# Altium footprint library BMS_Slave.PcbLib: 58 footprints (part 1 of 4)
Each footprint in its own frame and in the unit in brackets; x right, y up, seen from the top. Pads: shape width x height; smd on the part's side, far side on the other; paste and mask are expansions set on the pad; w line width, h text height; cw(c..) or ccw(c..) is an arc to the next point about the centre after c.
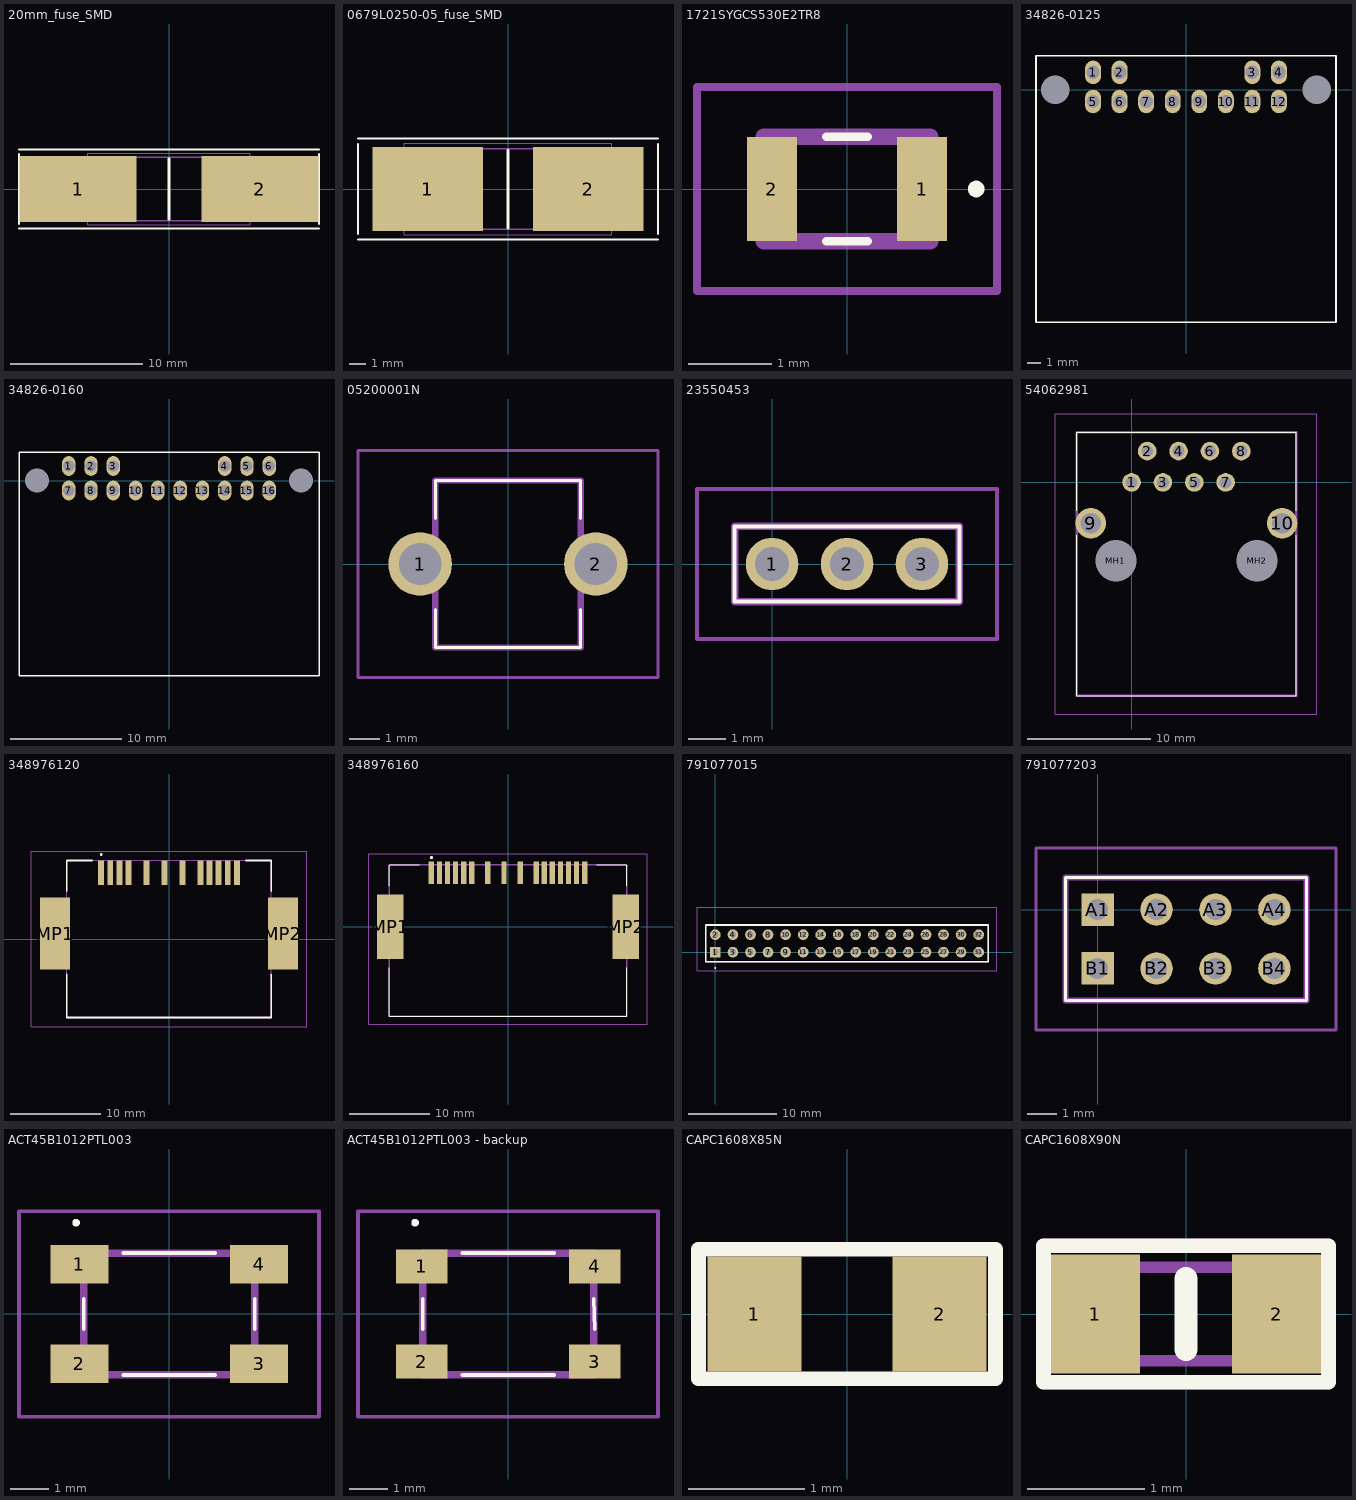
[diagram p0: the footprints below, top view; thin cyan lines are the x and y axes]

## 20mm_fuse_SMD [mm]
pads (2):
  rect 8.89x5 smd: 1(-6.895,0) 2(6.895,0)
Top Overlay:
  lines w0.127: -11.379,-3 11.379,-3 ; -11.379,-2.667 -11.379,2.667 ; -11.379,3 11.379,3 ; 11.379,-2.667 11.379,2.667
  lines w0.2: 0,-2.29 0,2.29
Mechanical 13:
  lines w0.1: -5.43,-2.39 5.43,-2.39 5.43,2.39 -5.43,2.39 -5.43,-2.39
Mechanical 15:
  lines w0.05: -6.15,-2.705 6.15,-2.705 6.15,2.705 -6.15,2.705 -6.15,-2.705
3D body "0885001.DR.stp": height 4.88, standoff 0, extent -5.43,-2.39 5.43,2.39

## 0679L0250-05_fuse_SMD [mm] "125VDC, Irated=0.25A Fuse"
pads (2):
  rect 6.533x5 smd: 1(-4.75,0) 2(4.75,0)
Top Overlay:
  lines w0.127: -8.89,-3 8.89,-3 ; -8.89,-2.667 -8.89,2.667 ; -8.89,3 8.89,3 ; 8.89,-2.667 8.89,2.667
  lines w0.2: 0,-2.29 0,2.29
Mechanical 13:
  lines w0.1: -5.43,-2.39 5.43,-2.39 5.43,2.39 -5.43,2.39 -5.43,-2.39
Mechanical 15:
  lines w0.05: -6.15,-2.705 6.15,-2.705 6.15,2.705 -6.15,2.705 -6.15,-2.705
3D body "0679L0250-05.STEP": height 2.78, standoff -0.01, extent -3.05,-1.27 3.05,1.27

## 1721SYGCS530E2TR8 [mm]
pads (2):
  rect 0.6x1.25 smd: 1(0.9,0) 2(-0.9,0)
Top Overlay:
  lines w0.1: -0.25,-0.625 0.25,-0.625 ; -0.25,0.625 0.25,0.625 ; 1.5,0 ccw(c1.55,0) 1.6,0 ccw(c1.55,0) 1.5,0
Mechanical 13:
  lines w0.2: -1,-0.625 1,-0.625 1,0.625 -1,0.625 -1,-0.625
Mechanical 15:
  lines w0.1: -1.8,-1.225 1.8,-1.225 1.8,1.225 -1.8,1.225 -1.8,-1.225
3D body "17-21SYGC_S530-E2_TR8.stp": height 1.2, standoff 0, extent -1.14,-0.625 1.14,0.625

## 34826-0125 [mm] "Molex, MINI50, 12ckt"
pads (14):
  round 0 hole 2.15 mask+0.05: 0(-9.85,0) 0(9.85,0)
  oval 1.2x1.778 hole 1 mask+0.05: 1(-7,1.3) 2(-5,1.3) 3(5,1.3) 4(7,1.3) 5(-7,-0.9) 6(-5,-0.9) 7(-3,-0.9) 8(-1,-0.9) 9(1,-0.9) 10(3,-0.9) 11(5,-0.9) 12(7,-0.9)
Top Overlay:
  lines w0.127: -11.303,-17.526 -11.303,2.54 11.303,2.54 11.303,-17.526 -11.303,-17.526
3D body "348260125.stp": height 11.75, standoff -4.14, extent -11.314,-17.478 11.314,2.022

## 34826-0160 [mm] "Molex, MINI50, 16ckt"
pads (18):
  round 0 hole 2.15 mask+0.05: 0(-11.85,0) 0(11.85,0)
  oval 1.2x1.778 hole 1 mask+0.05: 1(-9,1.3) 2(-7,1.3) 3(-5,1.3) 4(5,1.3) 5(7,1.3) 6(9,1.3) 7(-9,-0.9) 8(-7,-0.9) 9(-5,-0.9) 10(-3,-0.9) 11(-1,-0.9) 12(1,-0.9) 13(3,-0.9) 14(5,-0.9) 15(7,-0.9) 16(9,-0.9)
Top Overlay:
  lines w0.127: -13.462,-17.526 -13.462,2.54 13.462,2.54 13.462,-17.526 -13.462,-17.526
3D body "348260160.stp": height 11.69, standoff -4.19, extent -13.314,-17.427 13.314,2.073

## 05200001N [mm]
pads (2):
  round 2.1 hole 1.4: 1(-2.9,0) 2(2.9,0)
Top Overlay:
  lines w0.1: -2.4,-1.5 -2.4,-2.75 2.4,-2.75 2.4,-1.5 ; -2.4,1.5 -2.4,2.75 2.4,2.75 2.4,1.5
Mechanical 13:
  lines w0.2: -2.4,-2.75 -2.4,2.75 2.4,2.75 2.4,-2.75 -2.4,-2.75
Mechanical 15:
  lines w0.1: -4.95,-3.75 -4.95,3.75 4.95,3.75 4.95,-3.75 -4.95,-3.75
3D body "05200001N.stp": height 8.1, standoff -5, extent -3.495,-2.75 3.5,2.75

## 23550453 [mm]
pads (3):
  round 1.4 hole 0.9: 1(0,0) 2(2,0) 3(4,0)
Top Overlay:
  lines w0.1: -1,-1 -1,1 5,1 5,-1 -1,-1
Mechanical 13:
  lines w0.2: -1,-1 -1,1 5,1 5,-1 -1,-1
Mechanical 15:
  lines w0.1: -2,-2 -2,2 6,2 6,-2 -2,-2
3D body "2355045-3.stp": height 5.54, standoff -2.76, extent -1,-1 5,1

## 54062981 [mm]
pads (12):
  round 1.509 hole 0.97: 1(0,0) 2(1.27,2.54) 3(2.54,0) 4(3.81,2.54) 5(5.08,0) 6(6.35,2.54) 7(7.62,0) 8(8.89,2.54)
  round 2.475 hole 1.65: 9(-3.3,-3.3) 10(12.19,-3.3)
  round 1.665 hole 3.33 unplated: MH1(-1.27,-6.35) MH2(10.16,-6.35)
Top Overlay:
  lines w0.1: -4.445,-4.3 -4.445,-17.27 13.335,-17.27 13.335,-4.3 ; -4.445,-2.3 -4.445,4.07 13.335,4.07 13.335,-2.3
Mechanical 13:
  lines w0.2: -4.445,-17.27 -4.445,4.07 13.335,4.07 13.335,-17.27 -4.445,-17.27
Mechanical 15:
  lines w0.1: -6.173,-18.76 -6.173,5.54 14.99,5.54 14.99,-18.76 -6.173,-18.76
3D body "5406298-1.stp": height 14.1, standoff -4.39, extent -4.437,-17.074 13.257,4.262

## 348976120 [mm]
pads (14):
  rect 0.66x2.75 smd: 1(-7.5,7.325) 2(-5.5,7.325) 3(4.5,7.325) 4(6.5,7.325) 5(-6.5,7.325) 6(-4.5,7.325) 7(-2.5,7.325) 8(-0.5,7.325) 9(1.5,7.325) 10(3.5,7.325) 11(5.5,7.325) 12(7.5,7.325)
  rect 3.32x8 smd: MP1(-12.6,0.605) MP2(12.6,0.605)
Top Overlay:
  lines w0.2: -11.31,-8.675 -11.31,-3.925 -11.31,-8.675 ; -11.31,-8.675 11.31,-8.675 ; -11.31,-8.675 11.31,-8.675 ; -11.31,8.7 -8.5,8.7 -11.31,8.7 ; -11.31,8.7 -11.31,5.325 -11.31,8.7 ; -7.5,9.3 cw(c-7.5,9.35) -7.5,9.4 ; -7.5,9.3 ccw(c-7.5,9.35) -7.5,9.4 ; -7.5,9.3 cw(c-7.5,9.35) -7.5,9.4 ; 11.31,-8.675 11.31,-3.925 11.31,-8.675 ; 11.31,8.7 11.31,5.325 11.31,8.7 ; 11.31,8.7 8.5,8.7 11.31,8.7
Mechanical 13:
  lines w0.1: -11.31,-8.7 -11.31,8.7 11.31,8.7 11.31,-8.7 -11.31,-8.7
Mechanical 15:
  lines w0.1: -15.26,-9.7 -15.26,9.7 15.26,9.7 15.26,-9.7 -15.26,-9.7
3D body "34897-6120.stp": height 12.54, standoff 0, extent -13.928,-8.7 13.928,8.7

## 348976160 [mm]
pads (18):
  rect 0.66x2.75 smd: 1(-9.5,6.72) 2(-7.5,6.72) 3(-5.5,6.72) 4(4.5,6.72) 5(6.5,6.72) 6(8.5,6.72) 7(-8.5,6.72) 8(-6.5,6.72) 9(-4.5,6.72) 10(-2.5,6.72) 11(-0.5,6.72) 12(1.5,6.72) 13(3.5,6.72) 14(5.5,6.72) 15(7.5,6.72) 16(9.5,6.72)
  rect 3.32x8 smd: MP1(-14.6,0) MP2(14.6,0)
Top Overlay:
  lines w0.1: -14.745,-5.08 -14.745,-11.08 14.6,-11.08 14.745,-11.08 14.745,-5.08 ; -14.745,5.08 -14.745,7.62 -14.6,7.72 -11,7.72 ; 11,7.72 14.6,7.72 14.745,7.62 14.745,5.08
  lines w0.2: -9.6,8.6 ccw(c-9.5,8.6) -9.4,8.6 ccw(c-9.5,8.6) -9.6,8.6
Mechanical 13:
  lines w0.2: -14.745,-11.08 14.745,-11.08 14.745,7.72 -14.745,7.72 -14.745,-11.08
Mechanical 15:
  lines w0.1: -17.26,-12.08 17.26,-12.08 17.26,9.095 -17.26,9.095 -17.26,-12.08
3D body "34897-6160.stp": height 11.98, standoff 0, extent -15.928,-11.08 15.928,8.029

## 791077015 [mm]
pads (32):
  rect 1.217x1.217 hole 0.673: 1(0,0)
  round 1.217 hole 0.673: 2(0,2) 3(2,0) 4(2,2) 5(4,0) 6(4,2) 7(6,0) 8(6,2) 9(8,0) 10(8,2) 11(10,0) 12(10,2) 13(12,0) 14(12,2) 15(14,0) 16(14,2) 17(16,0) 18(16,2) 19(18,0) 20(18,2) 21(20,0) 22(20,2) 23(22,0) 24(22,2) 25(24,0) 26(24,2) 27(26,0) 28(26,2) 29(28,0) 30(28,2) 31(30,0) 32(30,2)
Top Overlay:
  lines w0.1: 0,-1.86 cw(c0,-1.81) 0,-1.76 cw(c0,-1.81) 0,-1.86
  lines w0.2: -1.095,-1.095 -1.095,3.095 31.095,3.095 31.095,-1.095 -1.095,-1.095
Mechanical 13:
  lines w0.1: -1.095,-1.095 -1.095,3.095 31.095,3.095 31.095,-1.095 -1.095,-1.095
Mechanical 15:
  lines w0.1: -2.095,-2.095 -2.095,5.1 32.095,5.1 32.095,-2.095 -2.095,-2.095
3D body "79107-7015.stp": height 4.47, standoff -2.97, extent -1.058,-1.162 31.132,3.028

## 791077203 [mm]
pads (8):
  rect 1.1x1.1 hole 0.71: A1(0,0) B1(0,-2)
  round 1.1 hole 0.71: A2(2,0) A3(4,0) A4(6,0) B2(2,-2) B3(4,-2) B4(6,-2)
Top Overlay:
  lines w0.1: -1.095,-3.095 7.095,-3.095 7.095,1.095 -1.095,1.095 -1.095,-3.095
Mechanical 13:
  lines w0.2: -1.095,-3.095 7.095,-3.095 7.095,1.095 -1.095,1.095 -1.095,-3.095
Mechanical 15:
  lines w0.1: -2.095,-4.095 8.095,-4.095 8.095,2.095 -2.095,2.095 -2.095,-4.095
3D body "791077203.stp": height 4.44, standoff -1.91, extent -1.047,-3.111 7.143,1.079

## ACT45B1012PTL003 [mil]
pads (4):
  rect 60x40 smd: 1(-92.99,51.5) 2(-92.99,-51.5) 3(92.99,-51.5) 4(92.99,51.5)
Top Overlay:
  lines w3.94: -88.58,-15.75 -88.58,15.75 ; -47.24,-62.99 47.24,-62.99 ; -47.24,62.99 47.24,62.99 ; 88.58,-15.75 88.58,15.75 ; -98.43,94.49 ccw(c-96.46,94.49) -94.49,94.49 ccw(c-96.46,94.49) -98.43,94.49
Mechanical 13:
  lines w7.87: -88.58,-62.99 -88.58,62.99 88.58,62.99 88.58,-62.99 -88.58,-62.99
Mechanical 15:
  lines w3.94: -155.51,-106.3 -155.51,106.3 155,106.3 155,-106.3 -155.51,-106.3
3D body "ACT45B-101-2P-TL003.stp": height 122.05, standoff 0, extent -112.6,-63.39 112.6,63.39

## ACT45B1012PTL003 - backup [mm]
pads (4):
  rect 1.35x0.9 smd: 1(-2.275,1.25) 2(-2.275,-1.25) 3(2.275,-1.25) 4(2.275,1.25)
Top Overlay:
  lines w0.1: -2.25,-0.4 -2.25,0.4 ; -1.2,-1.6 1.2,-1.6 ; -1.2,1.6 1.2,1.6 ; 2.25,0.4 2.275,-0.4 ; -2.5,2.4 ccw(c-2.45,2.4) -2.4,2.4 ccw(c-2.45,2.4) -2.5,2.4
Mechanical 13:
  lines w0.2: -2.25,-1.6 -2.25,1.6 2.25,1.6 2.25,-1.6 -2.25,-1.6
Mechanical 15:
  lines w0.1: -3.95,-2.7 -3.95,2.7 3.937,2.7 3.937,-2.7 -3.95,-2.7
3D body "ACT45B-101-2P-TL003.stp": height 3.1, standoff 0, extent -2.86,-1.61 2.86,1.61

## CAPC1608X85N [mil]
pads (2):
  rect 32x39 smd: 1(-31.5,0) 2(31.5,0)
Top Overlay:
  lines w5: -50.5,-22 50.5,-22 50.5,22 -50.5,22 -50.5,-22
3D body "C0603C103K1RACTU.stp": height 33.09, standoff -1.17, extent -34.44,-17.4 34.45,20

## CAPC1608X90N [mil]
pads (2):
  rect 30x40 smd: 1(-30.5,0) 2(30.5,0)
Top Overlay:
  lines w5: -48,-23 48,-23 48,23 -48,23 -48,-23
  lines w7.87: 0,-11.81 0,11.81
Mechanical 13:
  lines w3.94: -31.5,-15.75 -31.5,15.75 31.5,15.75 31.5,-15.75 -31.5,-15.75
Mechanical 15:
  lines w1.97: -48.03,-24.41 -48.03,24.41 48.03,24.41 48.03,-24.41 -48.03,-24.41
3D body "CGA3E1X7R1C105K080AC.stp": height 35.43, standoff 0, extent -31.5,-15.75 31.5,15.75